# Altium footprint library 20-Switches.PcbLib: 110 footprints (part 6 of 7)
Each footprint in its own frame and in the unit in brackets; x right, y up, seen from the top. Pads: shape width x height; smd on the part's side, far side on the other; paste and mask are expansions set on the pad; w line width, h text height; cw(c..) or ccw(c..) is an arc to the next point about the centre after c.
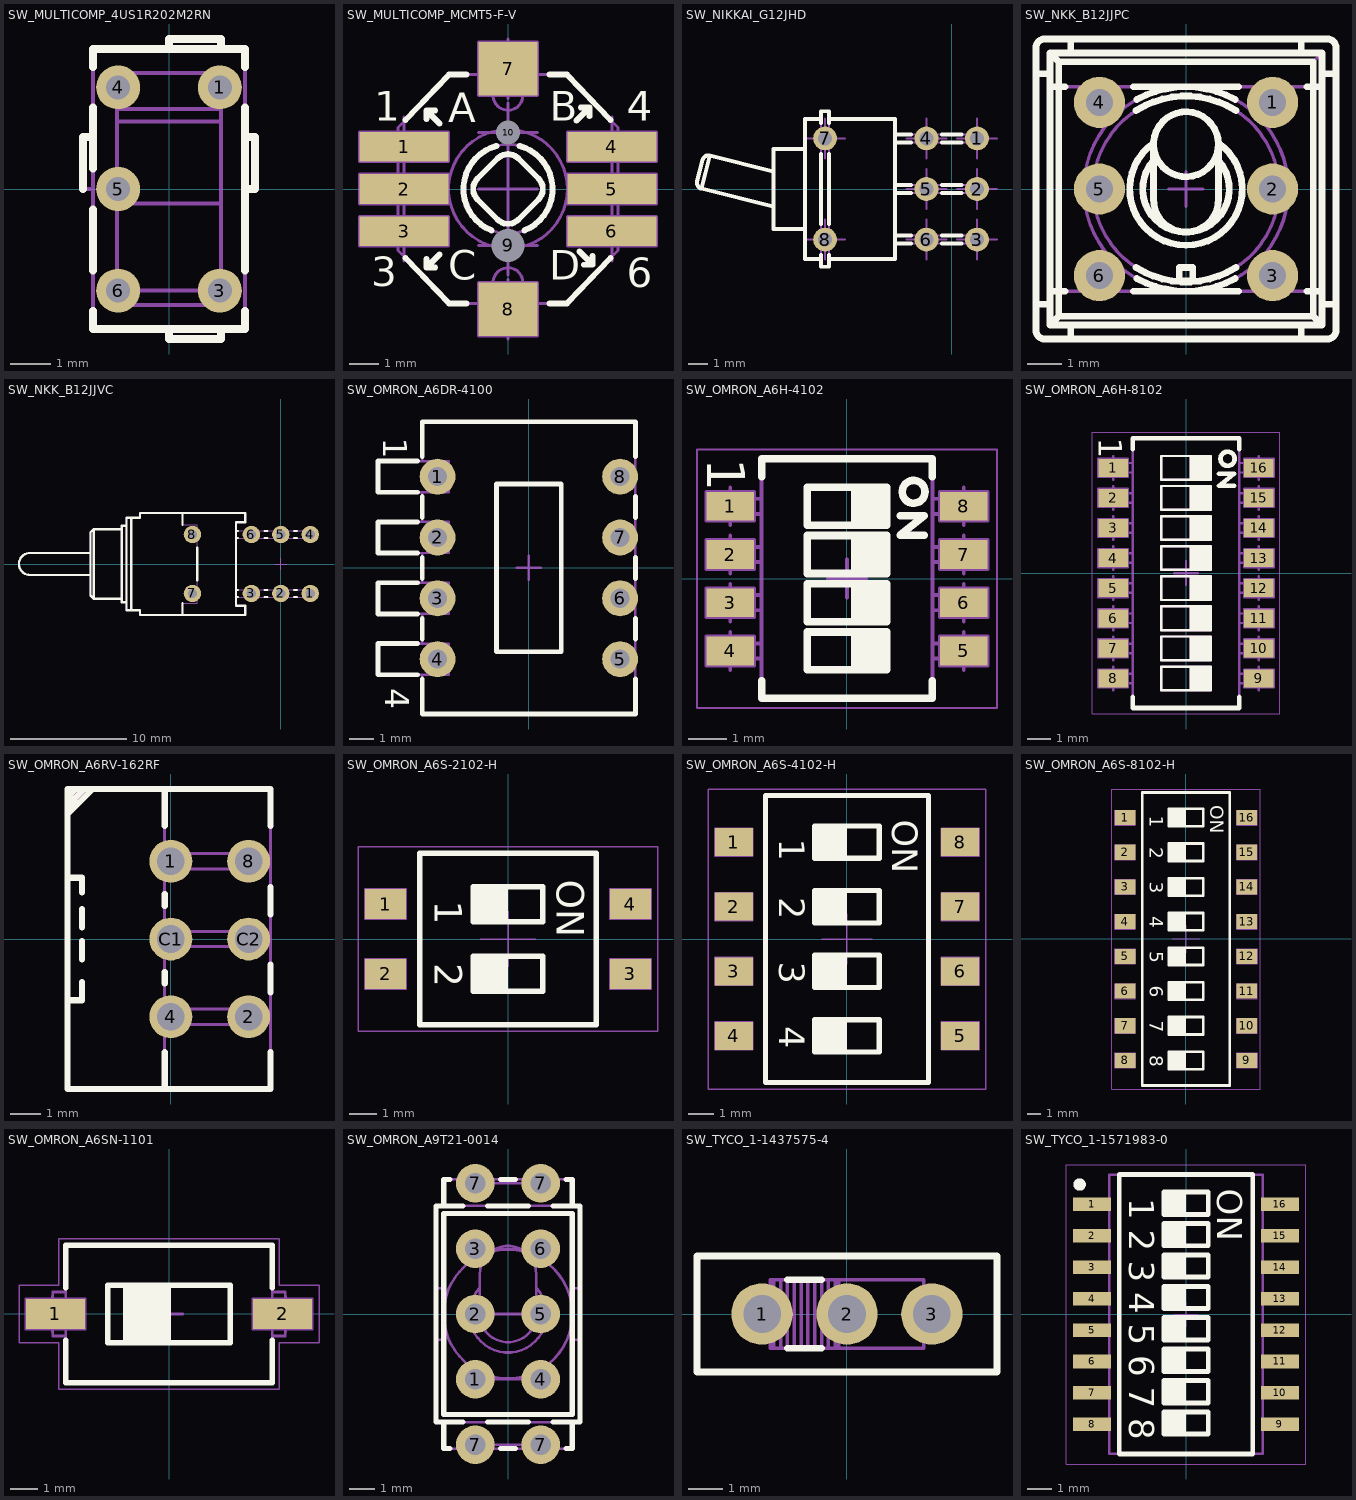
[diagram p5: the footprints below, top view; thin cyan lines are the x and y axes]

## SW_MULTICOMP_4US1R202M2RN [mm] "Pitch 2.45mm, Body 7.5x5mm, SPDT Switch, On-On, Lever"
height 10.8
pads (5):
  round 1.1 hole 0.6: 1(1.27,2.54) 3(1.27,-2.54) 4(-1.27,2.54) 5(-1.27,0) 6(-1.27,-2.54)
Top Overlay:
  lines w0.2: -2.15,0 -2.15,1.3 -1.9,1.3 ; -1.9,-3.047 -1.9,-3.5 1.9,-3.5 1.9,-3.047 ; -1.9,-2.033 -1.9,-0.507 ; -1.9,0.507 -1.9,2.033 ; -1.9,3.047 -1.9,3.5 1.9,3.5 1.9,3.047 ; 0,-3.5 0,-3.75 1.3,-3.75 1.3,-3.5 ; 0,3.5 0,3.75 1.3,3.75 1.3,3.5 ; 1.9,-2.033 1.9,2.033 ; 1.9,0 2.15,0 2.15,1.3 1.9,1.3
Mechanical 8:
  circle w0.1: c1.27,-2.54 r0.3
  circle w0.1: c1.27,2.54 r0.3
  circle w0.1: c-1.27,2.54 r0.3
  circle w0.1: c-1.27,0 r0.3
  circle w0.1: c-1.27,-2.54 r0.3
  lines w0.1: -1.57,-2.54 -1.27,-2.54 -1.27,-2.84 ; -1.57,0 -1.27,0 -1.27,-0.3 ; -1.57,2.54 -1.27,2.54 -1.27,2.24 ; 1.27,-2.84 1.27,-2.54 1.57,-2.54 ; 1.27,2.24 1.27,2.54 1.57,2.54
  text "5" at -0.52,-0.5 h1
  text "4" at -0.52,2.04 h1
  text "6" at -0.52,-3.04 h1
Mechanical 14:
  lines w0.1: -1.9,0 -2.15,0 -2.15,1.3 -1.9,1.3 ; -1.3,-2.538 1.3,-2.538 ; -1.3,-0.368 1.3,-0.368 ; -1.3,1.685 1.3,1.685 ; -1.3,1.996 1.3,1.996 ; 0,-3.5 0,-3.75 1.3,-3.75 1.3,-3.5 ; 0,3.5 0,3.75 1.3,3.75 1.3,3.5 ; 1.9,0 2.15,0 2.15,1.3 1.9,1.3 ; -1.9,-3.5 -1.9,3.5 1.9,3.5 1.9,-3.5 -1.9,-3.5 ; -1.3,-2.9 1.3,-2.9 1.3,2.9 -1.3,2.9 -1.3,-2.9
3D body "SW_MULTICOMP_4US1R202M2RN.stp": height 10.65, standoff -2.6, extent -2.15,-3.75 2.15,3.75

## SW_MULTICOMP_MCMT5-F-V [mm] "Navigation Switch - Multidirectional 5 Way (4-directional and center push)"
height 4.5
pads (10):
  rect 3x1 smd: 1(-3.5,1.425) 2(-3.5,0) 3(-3.5,-1.425) 4(3.5,1.425) 5(3.5,0) 6(3.5,-1.425)
  rect 2x1.8 smd: 7(0,4.05) 8(0,-4.05)
  round 1 hole 1.1 unplated: 9(0,-1.9)
  round 0.5 hole 0.8 unplated: 10(0,1.9)
Top Overlay:
  lines w0.2: -3.452,-2.325 -1.986,-3.85 -1.4,-3.85 ; -3.452,2.325 -1.986,3.85 -1.4,3.85 ; -2.75,-2.35 -2.75,-2.65 ; -2.75,2.35 -2.75,2.65 ; -2.45,-2.65 -2.75,-2.65 ; -2.45,2.65 -2.75,2.65 ; -2.3,-2.2 -2.75,-2.65 ; -2.3,2.2 -2.75,2.65 ; -0.554,-1.394 cw(c0,0) -0.394,1.447 ; 0.394,1.447 cw(c0,0) 0.554,-1.394 ; 1.4,-3.85 1.986,-3.85 3.452,-2.325 ; 1.4,3.85 1.986,3.85 3.452,2.325 ; 2.3,2.3 2.75,2.75 ; 2.4,-2.1 2.85,-2.55 ; 2.45,2.75 2.75,2.75 ; 2.55,-2.55 2.85,-2.55 ; 2.75,2.45 2.75,2.75 ; 2.85,-2.25 2.85,-2.55 ; -1.025,-0.354 cw(c-0.672,0) -1.025,0.354 -0.354,1.025 cw(c0,0.672) 0.354,1.025 1.025,0.354 cw(c0.672,0) 1.025,-0.354 0.354,-1.025 cw(c0,-0.672) -0.354,-1.025 -1.025,-0.354
  text "1" at -4.5,2.3 h1
  text "4" at 4,2.3 h1
  text "6" at 3.993,-3.311 h1
  text "3" at -4.607,-3.278 h1
  text "B" at 1.4,2.3 h1
  text "D" at 1.382,-3.06 h1
  text "A" at -2.018,2.24 h1
  text "C" at -2.018,-3.06 h1
Mechanical 8:
  lines w0.1: -4.5,-1.425 -3.5,-1.425 ; -4.5,0 -3.5,0 ; -4.5,1.425 -3.5,1.425 ; -3.5,-2.425 -3.5,-1.425 ; -3.5,-1 -3.5,0 ; -3.5,-0.425 -3.5,-1.425 ; -3.5,0.425 -3.5,1.425 ; -3.5,1 -3.5,0 ; -3.5,2.425 -3.5,1.425 ; -2.5,-1.425 -3.5,-1.425 ; -2.5,0 -3.5,0 ; -2.5,1.425 -3.5,1.425 ; -1,-4.05 0,-4.05 ; -1,-1.9 0,-1.9 ; -1,0 0,0 ; -1,1.9 0,1.9 ; -1,3.65 1,3.65 ; -1,4.05 0,4.05 ; 0,-5.05 0,-4.05 ; 0,-3.05 0,-4.05 ; 0,-2.9 0,-1.9 ; 0,-1 0,0 ; 0,-0.9 0,-1.9 ; 0,0.9 0,1.9 ; 0,1 0,0 ; 0,2.9 0,1.9 ; 0,3.05 0,4.05 ; 0,5.05 0,4.05 ; 1,-4.05 0,-4.05 ; 1,-1.9 0,-1.9 ; 1,0 0,0 ; 1,1.9 0,1.9 ; 1,4.05 0,4.05 ; 2.5,-1.425 3.5,-1.425 ; 2.5,0 3.5,0 ; 2.5,1.425 3.5,1.425 ; 3.5,-2.425 3.5,-1.425 ; 3.5,-1 3.5,0 ; 3.5,-0.425 3.5,-1.425 ; 3.5,0.425 3.5,1.425 ; 3.5,1 3.5,0 ; 3.5,2.425 3.5,1.425 ; 4.5,-1.425 3.5,-1.425 ; 4.5,0 3.5,0 ; 4.5,1.425 3.5,1.425 ; -5,-1.925 -5,-0.925 -2,-0.925 -2,-1.925 -5,-1.925 ; -5,-0.5 -5,0.5 -2,0.5 -2,-0.5 -5,-0.5 ; -5,0.925 -5,1.925 -2,1.925 -2,0.925 -5,0.925 ; -1,-4.95 1,-4.95 1,-3.15 -1,-3.15 -1,-4.95 ; -1,3.15 1,3.15 1,4.95 -1,4.95 -1,3.15 ; 2,-1.925 2,-0.925 5,-0.925 5,-1.925 2,-1.925 ; 2,-0.5 2,0.5 5,0.5 5,-0.5 2,-0.5 ; 2,0.925 2,1.925 5,1.925 5,0.925 2,0.925
Mechanical 14:
  circle w0.1: c0,0 r2
  circle w0.1: c0,-3.15 r0.5
  circle w0.1: c3,0 r0.5
  circle w0.1: c0,3.15 r0.5
  circle w0.1: c-3,0 r0.5
  circle w0.1: c0,0 r1.5
  lines w0.1: -3.7,-1.775 -4.5,-1.775 -4.5,-1.075 -3.7,-1.075 ; -3.7,-0.35 -4.5,-0.35 -4.5,0.35 -3.7,0.35 ; -3.7,1.075 -4.5,1.075 -4.5,1.775 -3.7,1.775 ; -2.75,-2.35 -2.75,-2.65 ; -2.75,2.35 -2.75,2.65 ; -2.45,-2.65 -2.75,-2.65 ; -2.45,2.65 -2.75,2.65 ; -2.3,-2.2 -2.75,-2.65 ; -2.3,2.2 -2.75,2.65 ; -0.8,-3.85 -0.8,-4.45 0.8,-4.45 0.8,-3.85 ; -0.8,3.85 -0.8,4.45 0.8,4.45 0.8,3.85 ; 2.3,2.3 2.75,2.75 ; 2.4,-2.1 2.85,-2.55 ; 2.45,2.75 2.75,2.75 ; 2.55,-2.55 2.85,-2.55 ; 2.75,2.45 2.75,2.75 ; 2.85,-2.25 2.85,-2.55 ; 3.7,-1.775 4.5,-1.775 4.5,-1.075 3.7,-1.075 ; 3.7,-0.35 4.5,-0.35 4.5,0.35 3.7,0.35 ; 3.7,1.075 4.5,1.075 4.5,1.775 3.7,1.775 ; -3.7,-2.067 -1.986,-3.85 1.986,-3.85 3.7,-2.067 3.7,2.067 1.986,3.85 -1.986,3.85 -3.7,2.067 -3.7,-2.067 ; -1.025,-0.354 cw(c-0.672,0) -1.025,0.354 -0.354,1.025 cw(c0,0.672) 0.354,1.025 1.025,0.354 cw(c0.672,0) 1.025,-0.354 0.354,-1.025 cw(c0,-0.672) -0.354,-1.025 -1.025,-0.354
  text "1" at -4.5,2.3 h1
  text "4" at 4,2.3 h1
  text "6" at 3.993,-3.311 h1
  text "3" at -4.607,-3.278 h1
  text "B" at 1.4,2.3 h1
  text "D" at 1.382,-3.06 h1
  text "A" at -2.018,2.24 h1
  text "C" at -2.018,-3.06 h1
3D body "SW_MULTICOMP_MCMT5-F-V.stp": height 4.5, standoff -0.5, extent -4.5,-4.45 4.5,4.45

## SW_NIKKAI_G12JHD [mm] "Body 7x4.5mm, Toggle SPDT Switch - Right Angled PCB Mounting With Clear Toggle Amber Led, NIKKAI G Series"
height 4.9
pads (8):
  round 1.2 hole 0.7: 1(1.27,2.54) 2(1.27,0) 3(1.27,-2.54) 4(-1.27,2.54) 5(-1.27,0) 6(-1.27,-2.54) 7(-6.35,2.54) 8(-6.35,-2.54)
Top Overlay:
  lines w0.2: -8.95,-0.876 -12.552,0.022 ; -8.95,0.876 -12.14,1.671 ; -7.35,-2 -8.95,-2 -8.95,2 -7.35,2 ; -6.55,-3.5 -7.35,-3.5 -7.35,3.5 -6.55,3.5 ; -6.55,-3.315 -6.55,-3.9 -6.15,-3.9 -6.15,-3.315 ; -6.55,-1.765 -6.55,1.765 ; -6.55,3.315 -6.55,3.9 -6.15,3.9 -6.15,3.315 ; -6.15,-3.5 -2.85,-3.5 -2.85,3.5 -6.15,3.5 ; -6.15,-1.765 -6.15,1.765 ; -2.85,-2.74 -2.045,-2.74 ; -2.85,-2.34 -2.045,-2.34 ; -2.85,-0.2 -2.045,-0.2 ; -2.85,0.196 -2.046,0.196 ; -2.85,2.34 -2.045,2.34 ; -2.85,2.74 -2.045,2.74 ; -0.495,-2.74 0.495,-2.74 ; -0.495,-2.34 0.495,-2.34 ; -0.495,-0.2 0.495,-0.2 ; -0.495,2.34 0.495,2.34 ; -0.495,2.74 0.495,2.74 ; -0.494,0.196 0.494,0.196 ; -12.552,0.022 cw(c-12.479,0.313) -12.77,0.386 -12.504,1.453 cw(c-12.213,1.38) -12.14,1.671 ; -12.552,0.022 -12.14,1.671
Mechanical 8:
  lines w0.1: -7.35,-2.54 -6.35,-2.54 ; -7.35,2.54 -6.35,2.54 ; -6.35,-3.54 -6.35,-2.54 ; -6.35,-1.54 -6.35,-2.54 ; -6.35,1.54 -6.35,2.54 ; -6.35,3.54 -6.35,2.54 ; -5.35,-2.54 -6.35,-2.54 ; -5.35,2.54 -6.35,2.54 ; -2.27,-2.54 -1.27,-2.54 ; -2.27,0 -1.27,0 ; -2.27,2.54 -1.27,2.54 ; -1.27,-3.54 -1.27,-2.54 ; -1.27,-1.54 -1.27,-2.54 ; -1.27,-1 -1.27,0 ; -1.27,1 -1.27,0 ; -1.27,1.54 -1.27,2.54 ; -1.27,3.54 -1.27,2.54 ; -0.27,-2.54 -1.27,-2.54 ; -0.27,0 -1.27,0 ; -0.27,2.54 -1.27,2.54 ; 0.27,-2.54 1.27,-2.54 ; 0.27,0 1.27,0 ; 0.27,2.54 1.27,2.54 ; 1.27,-3.54 1.27,-2.54 ; 1.27,-1.54 1.27,-2.54 ; 1.27,-1 1.27,0 ; 1.27,1 1.27,0 ; 1.27,1.54 1.27,2.54 ; 1.27,3.54 1.27,2.54 ; 2.27,-2.54 1.27,-2.54 ; 2.27,0 1.27,0 ; 2.27,2.54 1.27,2.54
Mechanical 14:
  lines w0.1: -8.95,-0.876 -12.552,0.022 ; -8.95,0.876 -12.14,1.671 ; -7.35,-2 -8.95,-2 -8.95,2 -7.35,2 ; -6.55,-3.5 -7.35,-3.5 -7.35,3.5 -6.55,3.5 ; -6.15,-3.5 -2.85,-3.5 -2.85,3.5 -6.15,3.5 ; -2.85,-2.74 1.27,-2.74 ccw(c1.27,-2.54) 1.27,-2.34 -2.85,-2.34 ; -2.85,-0.2 1.27,-0.2 ccw(c1.27,0) 1.27,0.2 ; -2.85,0.196 1.27,0.196 ; -2.85,2.34 1.27,2.34 ccw(c1.27,2.54) 1.27,2.74 -2.85,2.74 ; -12.552,0.022 cw(c-12.479,0.313) -12.77,0.386 -12.504,1.453 cw(c-12.213,1.38) -12.14,1.671 ; -12.552,0.022 -12.14,1.671 ; -6.55,-3.9 -6.15,-3.9 -6.15,3.9 -6.55,3.9 -6.55,-3.9
3D body "SW_NIKKAI_G12JHD.stp": height 4.9, standoff -3.1, extent -12.779,-3.9 1.47,3.9

## SW_NKK_B12JJPC [mm] "Body 8.8x8.8mm, Straight PCB Mounting  Subminiature Fully Red Illuminated Toggle SPDT Switch, NKK B Series"
height 19.4
pads (6):
  round 1.5 hole 0.8: 1(2.54,2.54) 2(2.54,0) 3(2.54,-2.54) 4(-2.54,2.54) 5(-2.54,0) 6(-2.54,-2.54)
Top Overlay:
  circle w0.2: c0,1.314 r0.953
  lines w0.2: -4.394,-3.378 -3.988,-3.378 ; -4.394,3.378 -3.988,3.378 ; -3.988,-2.997 -3.54,-2.997 ; -3.988,2.997 -3.54,2.997 ; -3.378,-4.394 -3.378,-3.988 ; -3.378,3.988 -3.378,4.394 ; -1.54,-2.997 1.54,-2.997 ; -1.54,2.997 1.54,2.997 ; -1.467,-2.299 ccw(c0,0) 1.467,-2.299 ; -1.467,2.299 cw(c0,0) 1.467,2.299 ; -1.443,-2.627 ccw(c0,0) 1.443,-2.627 ; -1.443,2.627 cw(c0,0) 1.443,2.627 ; -0.953,0.84 ccw(c0,0) 0.953,0.84 ; -0.953,1.314 -0.953,-0.286 ccw(c0,-0.309) 0.952,-0.286 0.953,1.314 ; -0.952,1.349 ccw(c0,0) 0.952,1.349 ; 3.378,-4.394 3.378,-3.988 ; 3.378,3.988 3.378,4.394 ; 3.54,-2.997 3.988,-2.997 ; 3.54,2.997 3.988,2.997 ; 3.988,-3.378 4.394,-3.378 ; 3.988,3.378 4.394,3.378 ; -3.988,-3.988 -3.734,-3.734 ; -3.988,-3.988 -3.988,3.988 ; -3.988,-3.988 3.988,-3.988 ; -3.988,3.988 -3.734,3.734 ; -3.988,3.988 3.988,3.988 3.988,-3.988 ; -3.734,-3.734 -3.734,3.734 ; -3.734,-3.734 3.734,-3.734 ; -3.734,3.734 3.734,3.734 3.734,-3.734 ; 3.734,-3.734 3.988,-3.988 ; -4.4,-4.146 ccw(c-4.146,-4.146) -4.146,-4.4 4.146,-4.4 ccw(c4.146,-4.146) 4.4,-4.146 4.4,4.146 ccw(c4.146,4.146) 4.146,4.4 -4.146,4.4 ccw(c-4.146,4.146) -4.4,4.146 -4.4,-4.146 ; -0.2,-2.7 -0.2,-2.3 0.2,-2.3 0.2,-2.7 -0.2,-2.7
Mechanical 8:
  lines w0.1: -3.04,-2.54 -2.54,-2.54 ; -3.04,0 -2.54,0 ; -3.04,2.54 -2.54,2.54 ; -2.54,-3.04 -2.54,-2.54 ; -2.54,-2.04 -2.54,-2.54 ; -2.54,-0.5 -2.54,0 ; -2.54,0.5 -2.54,0 ; -2.54,2.04 -2.54,2.54 ; -2.54,3.04 -2.54,2.54 ; -2.04,-2.54 -2.54,-2.54 ; -2.04,0 -2.54,0 ; -2.04,2.54 -2.54,2.54 ; -0.5,0 0,0 ; 0,-0.5 0,0 ; 0,0.5 0,0 ; 0.5,0 0,0 ; 2.04,-2.54 2.54,-2.54 ; 2.04,0 2.54,0 ; 2.04,2.54 2.54,2.54 ; 2.54,-3.04 2.54,-2.54 ; 2.54,-2.04 2.54,-2.54 ; 2.54,-0.5 2.54,0 ; 2.54,0.5 2.54,0 ; 2.54,2.04 2.54,2.54 ; 2.54,3.04 2.54,2.54 ; 3.04,-2.54 2.54,-2.54 ; 3.04,0 2.54,0 ; 3.04,2.54 2.54,2.54
Mechanical 14:
  circle w0.1: c0,0 r2.727
  circle w0.1: c0,1.314 r0.953
  circle w0.1: c0,0 r2.997
  lines w0.1: -4.394,-3.378 -3.988,-3.378 ; -4.394,3.378 -3.988,3.378 ; -3.988,-2.997 3.988,-2.997 ; -3.988,2.997 3.988,2.997 ; -3.378,-4.394 -3.378,-3.988 ; -3.378,3.988 -3.378,4.394 ; -0.953,0.84 ccw(c0,0) 0.953,0.84 ; -0.953,1.314 -0.953,-0.286 ccw(c0,-0.309) 0.952,-0.286 0.953,1.314 ; -0.952,1.349 ccw(c0,0) 0.952,1.349 ; 3.378,-4.394 3.378,-3.988 ; 3.378,3.988 3.378,4.394 ; 3.988,-3.378 4.394,-3.378 ; 3.988,3.378 4.394,3.378 ; -3.988,-3.988 -3.734,-3.734 ; -3.988,-3.988 -3.988,3.988 ; -3.988,-3.988 3.988,-3.988 ; -3.988,3.988 -3.734,3.734 ; -3.988,3.988 3.988,3.988 ; -3.734,-3.734 -3.734,3.734 ; -3.734,-3.734 3.734,-3.734 ; -3.734,3.734 3.734,3.734 ; 3.734,-3.734 3.988,-3.988 ; 3.734,-3.734 3.734,3.734 ; 3.734,3.734 3.988,3.988 ; 3.988,-3.988 3.988,3.988 ; -4.4,-4.146 ccw(c-4.146,-4.146) -4.146,-4.4 4.146,-4.4 ccw(c4.146,-4.146) 4.4,-4.146 4.4,4.146 ccw(c4.146,4.146) 4.146,4.4 -4.146,4.4 ccw(c-4.146,4.146) -4.4,4.146 -4.4,-4.146 ; -0.2,-2.7 0.2,-2.7 0.2,-2.3 -0.2,-2.3 -0.2,-2.7
3D body "SW_NKK_B12JJPC.stp": height 19.26, standoff -3.1, extent -4.394,-4.394 4.394,4.394

## SW_NKK_B12JJVC [mm] "Body 8.8x8.8mm,Right Angle PCB Mounting , Vertical Actuator,  Subminiature Fully Red Illuminated Toggle SPDT Switch, NKK B Series"
height 8.8
pads (8):
  round 1.5 hole 0.8: 1(2.54,-2.54) 2(0,-2.54) 3(-2.54,-2.54) 4(2.54,2.54) 5(0,2.54) 6(-2.54,2.54) 7(-7.62,-2.54) 8(-7.62,2.54)
Top Overlay:
  lines w0.2: -21.614,0.952 -16.408,0.952 ; -21.599,0.952 ccw(c-21.618,0) -21.618,-0.953 -16.408,-0.953 ; -13.716,-2.997 -16.139,-2.997 ; -13.716,2.997 -16.139,2.997 ; -13.31,-3.302 -13.716,-3.302 -13.716,3.302 -13.31,3.302 ; -12.903,-3.988 -12.903,3.988 ; -8.484,-4.394 -8.484,-3.378 -8.479,-3.378 ; -8.484,4.394 -8.484,3.378 -8.479,3.378 ; -7.214,-1.411 -7.214,1.411 ; -3.861,-2.845 -3.701,-2.845 ; -3.861,-2.235 -3.701,-2.235 ; -3.861,2.235 -3.701,2.235 ; -3.861,2.845 -3.701,2.845 ; -1.379,-2.845 -1.161,-2.845 ; -1.379,-2.235 -1.161,-2.235 ; -1.379,2.235 -1.161,2.235 ; -1.379,2.845 -1.161,2.845 ; 1.161,-2.845 1.379,-2.845 ; 1.161,-2.235 1.379,-2.235 ; 1.161,2.235 1.379,2.235 ; 1.161,2.845 1.379,2.845 ; -16.139,-2.997 -16.139,2.997 ; -16.139,-2.997 -16.408,-2.725 -16.408,2.728 -16.139,2.997 ; -13.31,-3.988 -12.141,-3.988 -12.141,-4.394 -3.073,-4.394 -3.073,-3.607 -3.861,-3.607 -3.861,3.607 -3.073,3.607 -3.073,4.394 -12.136,4.394 -12.136,3.988 -13.31,3.988 -13.31,-3.988
Mechanical 8:
  lines w0.1: -8.12,-2.54 -7.62,-2.54 ; -8.12,2.54 -7.62,2.54 ; -7.62,-3.04 -7.62,-2.54 ; -7.62,-2.04 -7.62,-2.54 ; -7.62,2.04 -7.62,2.54 ; -7.62,3.04 -7.62,2.54 ; -7.12,-2.54 -7.62,-2.54 ; -7.12,2.54 -7.62,2.54 ; -3.04,-2.54 -2.54,-2.54 ; -3.04,2.54 -2.54,2.54 ; -2.54,-3.04 -2.54,-2.54 ; -2.54,-2.04 -2.54,-2.54 ; -2.54,2.04 -2.54,2.54 ; -2.54,3.04 -2.54,2.54 ; -2.04,-2.54 -2.54,-2.54 ; -2.04,2.54 -2.54,2.54 ; -0.5,-2.54 0,-2.54 ; -0.5,0 0,0 ; -0.5,2.54 0,2.54 ; 0,-3.04 0,-2.54 ; 0,-2.04 0,-2.54 ; 0,-0.5 0,0 ; 0,0.5 0,0 ; 0,2.04 0,2.54 ; 0,3.04 0,2.54 ; 0.5,-2.54 0,-2.54 ; 0.5,0 0,0 ; 0.5,2.54 0,2.54 ; 2.04,-2.54 2.54,-2.54 ; 2.04,2.54 2.54,2.54 ; 2.54,-3.04 2.54,-2.54 ; 2.54,-2.04 2.54,-2.54 ; 2.54,2.04 2.54,2.54 ; 2.54,3.04 2.54,2.54 ; 3.04,-2.54 2.54,-2.54 ; 3.04,2.54 2.54,2.54
Mechanical 14:
  lines w0.1: -21.614,0.952 -16.408,0.952 ; -21.599,0.952 ccw(c-21.618,0) -21.618,-0.953 -16.408,-0.953 ; -13.716,-2.997 -16.139,-2.997 ; -13.716,2.997 -16.139,2.997 ; -13.31,-3.302 -13.716,-3.302 -13.716,3.302 -13.31,3.302 ; -12.903,-3.988 -12.903,3.988 ; -8.484,-4.394 -8.484,-3.378 -7.214,-3.378 -7.214,3.378 -8.484,3.378 -8.484,4.394 ; -3.861,-2.845 2.54,-2.845 ccw(c2.54,-2.54) 2.54,-2.235 -3.861,-2.235 ; -3.861,2.235 2.54,2.235 ccw(c2.54,2.54) 2.54,2.845 -3.861,2.845 ; -16.139,-2.997 -16.139,2.997 ; -16.139,-2.997 -16.408,-2.725 -16.408,2.728 -16.139,2.997 ; -13.31,-3.988 -12.141,-3.988 -12.141,-4.394 -3.073,-4.394 -3.073,-3.607 -3.861,-3.607 -3.861,3.607 -3.073,3.607 -3.073,4.394 -12.136,4.394 -12.136,3.988 -13.31,3.988 -13.31,-3.988
3D body "SW_NKK_B12JJVC.stp": height 8.79, standoff -4.09, extent -22.57,-4.394 2.845,4.394

## SW_OMRON_A6DR-4100 [mm] "Pitch 2.54mm, Body 12.2x8.9mm, 4 Ways SPST Sealed Piano DIP Switch, OMRON A6DR"
height 7.6
pads (8):
  round 1.5 hole 0.8: 1(-3.81,3.81) 2(-3.81,1.27) 3(-3.81,-1.27) 4(-3.81,-3.81) 5(3.81,-3.81) 6(3.81,-1.27) 7(3.81,1.27) 8(3.81,3.81)
Top Overlay:
  lines w0.2: -4.635,-4.46 -6.3,-4.46 -6.3,-3.16 -4.635,-3.16 ; -4.635,-1.92 -6.3,-1.92 -6.3,-0.62 -4.635,-0.62 ; -4.635,0.62 -6.3,0.62 -6.3,1.92 -4.635,1.92 ; -4.635,3.16 -6.3,3.16 -6.3,4.46 -4.635,4.46 ; -4.45,-4.642 -4.45,-6.1 4.45,-6.1 4.45,-4.642 ; -4.45,-2.978 -4.45,-2.102 ; -4.45,-0.438 -4.45,0.438 ; -4.45,2.102 -4.45,2.978 ; -4.45,4.642 -4.45,6.1 4.45,6.1 4.45,4.642 ; 4.45,-2.978 4.45,-2.102 ; 4.45,-0.438 4.45,0.438 ; 4.45,2.102 4.45,2.978 ; -1.35,-3.5 1.35,-3.5 1.35,3.5 -1.35,3.5 -1.35,-3.5
  text "4" at -6,-5.025 h1
  text "1" at -6.075,5.425 h1
Mechanical 8:
  lines w0.1: -4.31,-3.81 -3.81,-3.81 ; -4.31,-1.27 -3.81,-1.27 ; -4.31,1.27 -3.81,1.27 ; -4.31,3.81 -3.81,3.81 ; -3.81,-4.31 -3.81,-3.81 ; -3.81,-3.31 -3.81,-3.81 ; -3.81,-1.77 -3.81,-1.27 ; -3.81,-0.77 -3.81,-1.27 ; -3.81,0.77 -3.81,1.27 ; -3.81,1.77 -3.81,1.27 ; -3.81,3.31 -3.81,3.81 ; -3.81,4.31 -3.81,3.81 ; -3.31,-3.81 -3.81,-3.81 ; -3.31,-1.27 -3.81,-1.27 ; -3.31,1.27 -3.81,1.27 ; -3.31,3.81 -3.81,3.81 ; -0.5,0 0,0 ; 0,-0.5 0,0 ; 0,0.5 0,0 ; 0.5,0 0,0 ; 3.31,-3.81 3.81,-3.81 ; 3.31,-1.27 3.81,-1.27 ; 3.31,1.27 3.81,1.27 ; 3.31,3.81 3.81,3.81 ; 3.81,-4.31 3.81,-3.81 ; 3.81,-3.31 3.81,-3.81 ; 3.81,-1.77 3.81,-1.27 ; 3.81,-0.77 3.81,-1.27 ; 3.81,0.77 3.81,1.27 ; 3.81,1.77 3.81,1.27 ; 3.81,3.31 3.81,3.81 ; 3.81,4.31 3.81,3.81 ; 4.31,-3.81 3.81,-3.81 ; 4.31,-1.27 3.81,-1.27 ; 4.31,1.27 3.81,1.27 ; 4.31,3.81 3.81,3.81
Mechanical 14:
  lines w0.1: -4.45,-4.46 -4.45,-6.1 4.45,-6.1 4.45,6.1 -4.45,6.1 -4.45,4.46 ; -4.45,-3.16 -4.45,-1.92 ; -4.45,-0.62 -4.45,0.62 ; -4.45,1.92 -4.45,3.16 ; -6.3,-4.46 -3.35,-4.46 -3.35,-3.16 -6.3,-3.16 -6.3,-4.46 ; -6.3,-1.92 -3.35,-1.92 -3.35,-0.62 -6.3,-0.62 -6.3,-1.92 ; -6.3,0.62 -3.35,0.62 -3.35,1.92 -6.3,1.92 -6.3,0.62 ; -6.3,3.16 -3.35,3.16 -3.35,4.46 -6.3,4.46 -6.3,3.16 ; -1.35,-3.5 1.35,-3.5 1.35,3.5 -1.35,3.5 -1.35,-3.5
3D body "SW_OMRON_A6DR-4100.stp": height 6.4, standoff -3.41, extent -6.3,-6.1 4.45,6.1

## SW_OMRON_A6H-4102 [mm] "Pitch 1.27mm, Body 6.31 x 4.5mm, 4 Ways SPST Surface-Mounting DIP Switch, OMRON A6H"
height 1.45
pads (8):
  rect 1.25x0.76 smd: 1(-3.075,1.905) 2(-3.075,0.635) 3(-3.075,-0.635) 4(-3.075,-1.905) 5(3.075,-1.905) 6(3.075,-0.635) 7(3.075,0.635) 8(3.075,1.905)
Top Overlay:
  circle w0.2: c1.755,2.286 r0.3
  lines w0.2: -2.25,-2.685 -2.25,-3.155 2.25,-3.155 2.25,-2.685 ; -2.25,2.685 -2.25,3.155 2.25,3.155 2.25,2.685 ; 0.2,-2.405 0.2,-1.405 ; 0.2,-1.135 0.2,-0.135 ; 0.2,0.135 0.2,1.135 ; 0.2,1.405 0.2,2.405 ; 0.3,-2.405 0.3,-1.405 ; 0.3,-1.135 0.3,-0.135 ; 0.3,0.135 0.3,1.135 ; 0.3,1.405 0.3,2.405 ; 0.4,-2.405 0.4,-1.405 ; 0.4,-1.135 0.4,-0.135 ; 0.4,0.135 0.4,1.135 ; 0.4,1.405 0.4,2.405 ; 0.5,-2.405 0.5,-1.405 ; 0.5,-1.135 0.5,-0.135 ; 0.5,0.135 0.5,1.135 ; 0.5,1.405 0.5,2.405 ; 0.6,-2.405 0.6,-1.405 ; 0.6,-1.135 0.6,-0.135 ; 0.6,0.135 0.6,1.135 ; 0.6,1.405 0.6,2.405 ; 0.7,-2.405 0.7,-1.405 ; 0.7,-1.135 0.7,-0.135 ; 0.7,0.135 0.7,1.135 ; 0.7,1.405 0.7,2.405 ; 0.8,-2.405 0.8,-1.405 ; 0.8,-1.135 0.8,-0.135 ; 0.8,0.135 0.8,1.135 ; 0.8,1.405 0.8,2.405 ; 0.9,-2.405 0.9,-1.405 ; 0.9,-1.135 0.9,-0.135 ; 0.9,0.135 0.9,1.135 ; 0.9,1.405 0.9,2.405 ; 1,-2.405 1,-1.405 ; 1,-1.135 1,-0.135 ; 1,0.135 1,1.135 ; 1,1.405 1,2.405 ; 1.397,1.651 2.032,1.651 1.397,1.143 2.032,1.143 ; -1.05,-2.405 1.05,-2.405 1.05,-1.405 -1.05,-1.405 -1.05,-2.405 ; -1.05,-1.135 1.05,-1.135 1.05,-0.135 -1.05,-0.135 -1.05,-1.135 ; -1.05,0.135 1.05,0.135 1.05,1.135 -1.05,1.135 -1.05,0.135 ; -1.05,1.405 1.05,1.405 1.05,2.405 -1.05,2.405 -1.05,1.405
  text "1" at -3.683,3.175 h1
Mechanical 8:
  lines w0.1: -3.575,-1.905 -3.075,-1.905 ; -3.575,-0.635 -3.075,-0.635 ; -3.575,0.635 -3.075,0.635 ; -3.575,1.905 -3.075,1.905 ; -3.075,-2.405 -3.075,-1.905 ; -3.075,-1.405 -3.075,-1.905 ; -3.075,-1.135 -3.075,-0.635 ; -3.075,-0.135 -3.075,-0.635 ; -3.075,0.135 -3.075,0.635 ; -3.075,1.135 -3.075,0.635 ; -3.075,1.405 -3.075,1.905 ; -3.075,2.405 -3.075,1.905 ; -2.575,-1.905 -3.075,-1.905 ; -2.575,-0.635 -3.075,-0.635 ; -2.575,0.635 -3.075,0.635 ; -2.575,1.905 -3.075,1.905 ; -0.5,0 0,0 ; 0,-0.5 0,0 ; 0,0.5 0,0 ; 0.5,0 0,0 ; 2.575,-1.905 3.075,-1.905 ; 2.575,-0.635 3.075,-0.635 ; 2.575,0.635 3.075,0.635 ; 2.575,1.905 3.075,1.905 ; 3.075,-2.405 3.075,-1.905 ; 3.075,-1.405 3.075,-1.905 ; 3.075,-1.135 3.075,-0.635 ; 3.075,-0.135 3.075,-0.635 ; 3.075,0.135 3.075,0.635 ; 3.075,1.135 3.075,0.635 ; 3.075,1.405 3.075,1.905 ; 3.075,2.405 3.075,1.905 ; 3.575,-1.905 3.075,-1.905 ; 3.575,-0.635 3.075,-0.635 ; 3.575,0.635 3.075,0.635 ; 3.575,1.905 3.075,1.905 ; -3.7,-2.285 -2.45,-2.285 -2.45,-1.525 -3.7,-1.525 -3.7,-2.285 ; -3.7,-1.015 -2.45,-1.015 -2.45,-0.255 -3.7,-0.255 -3.7,-1.015 ; -3.7,0.255 -2.45,0.255 -2.45,1.015 -3.7,1.015 -3.7,0.255 ; -3.7,1.525 -2.45,1.525 -2.45,2.285 -3.7,2.285 -3.7,1.525 ; 2.45,-2.285 3.7,-2.285 3.7,-1.525 2.45,-1.525 2.45,-2.285 ; 2.45,-1.015 3.7,-1.015 3.7,-0.255 2.45,-0.255 2.45,-1.015 ; 2.45,0.255 3.7,0.255 3.7,1.015 2.45,1.015 2.45,0.255 ; 2.45,1.525 3.7,1.525 3.7,2.285 2.45,2.285 2.45,1.525
Mechanical 14:
  lines w0.1: -2.25,-2.105 -2.87,-2.105 ; -2.25,-1.705 -2.87,-1.705 ; -2.25,-0.835 -2.87,-0.835 ; -2.25,-0.435 -2.87,-0.435 ; -2.25,0.435 -2.87,0.435 ; -2.25,0.835 -2.87,0.835 ; -2.25,1.705 -2.87,1.705 ; -2.25,2.105 -2.87,2.105 ; 0.2,-2.405 0.2,-1.405 ; 0.2,-1.135 0.2,-0.135 ; 0.2,0.135 0.2,1.135 ; 0.2,1.405 0.2,2.405 ; 0.3,-2.405 0.3,-1.405 ; 0.3,-1.135 0.3,-0.135 ; 0.3,0.135 0.3,1.135 ; 0.3,1.405 0.3,2.405 ; 0.4,-2.405 0.4,-1.405 ; 0.4,-1.135 0.4,-0.135 ; 0.4,0.135 0.4,1.135 ; 0.4,1.405 0.4,2.405 ; 0.5,-2.405 0.5,-1.405 ; 0.5,-1.135 0.5,-0.135 ; 0.5,0.135 0.5,1.135 ; 0.5,1.405 0.5,2.405 ; 0.6,-2.405 0.6,-1.405 ; 0.6,-1.135 0.6,-0.135 ; 0.6,0.135 0.6,1.135 ; 0.6,1.405 0.6,2.405 ; 0.7,-2.405 0.7,-1.405 ; 0.7,-1.135 0.7,-0.135 ; 0.7,0.135 0.7,1.135 ; 0.7,1.405 0.7,2.405 ; 0.8,-2.405 0.8,-1.405 ; 0.8,-1.135 0.8,-0.135 ; 0.8,0.135 0.8,1.135 ; 0.8,1.405 0.8,2.405 ; 0.9,-2.405 0.9,-1.405 ; 0.9,-1.135 0.9,-0.135 ; 0.9,0.135 0.9,1.135 ; 0.9,1.405 0.9,2.405 ; 1,-2.405 1,-1.405 ; 1,-1.135 1,-0.135 ; 1,0.135 1,1.135 ; 1,1.405 1,2.405 ; 2.25,-2.105 2.87,-2.105 ; 2.25,-1.705 2.87,-1.705 ; 2.25,-0.835 2.87,-0.835 ; 2.25,-0.435 2.87,-0.435 ; 2.25,0.435 2.87,0.435 ; 2.25,0.835 2.87,0.835 ; 2.25,1.705 2.87,1.705 ; 2.25,2.105 2.87,2.105 ; -2.87,-2.105 -3.35,-2.105 -3.35,-1.705 -2.87,-1.705 ; -2.87,-2.105 -2.87,-1.705 ; -2.87,-0.835 -3.35,-0.835 -3.35,-0.435 -2.87,-0.435 ; -2.87,-0.835 -2.87,-0.435 ; -2.87,0.435 -3.35,0.435 -3.35,0.835 -2.87,0.835 ; -2.87,0.435 -2.87,0.835 ; -2.87,1.705 -3.35,1.705 -3.35,2.105 -2.87,2.105 ; -2.87,1.705 -2.87,2.105 ; 2.87,-2.105 3.35,-2.105 3.35,-1.705 2.87,-1.705 ; 2.87,-2.105 2.87,-1.705 ; 2.87,-0.835 3.35,-0.835 3.35,-0.435 2.87,-0.435 ; 2.87,-0.835 2.87,-0.435 ; 2.87,0.435 3.35,0.435 3.35,0.835 2.87,0.835 ; 2.87,0.435 2.87,0.835 ; 2.87,1.705 3.35,1.705 3.35,2.105 2.87,2.105 ; 2.87,1.705 2.87,2.105 ; -2.25,-3.155 2.25,-3.155 2.25,3.155 -2.25,3.155 -2.25,-3.155 ; -1.05,-2.405 1.05,-2.405 1.05,-1.405 -1.05,-1.405 -1.05,-2.405 ; -1.05,-1.135 1.05,-1.135 1.05,-0.135 -1.05,-0.135 -1.05,-1.135 ; -1.05,0.135 1.05,0.135 1.05,1.135 -1.05,1.135 -1.05,0.135 ; -1.05,1.405 1.05,1.405 1.05,2.405 -1.05,2.405 -1.05,1.405